# Altium integrated library LEMO Unipole And Multipole Type Connectors.IntLib: 1566 symbols (part 5 of 13)
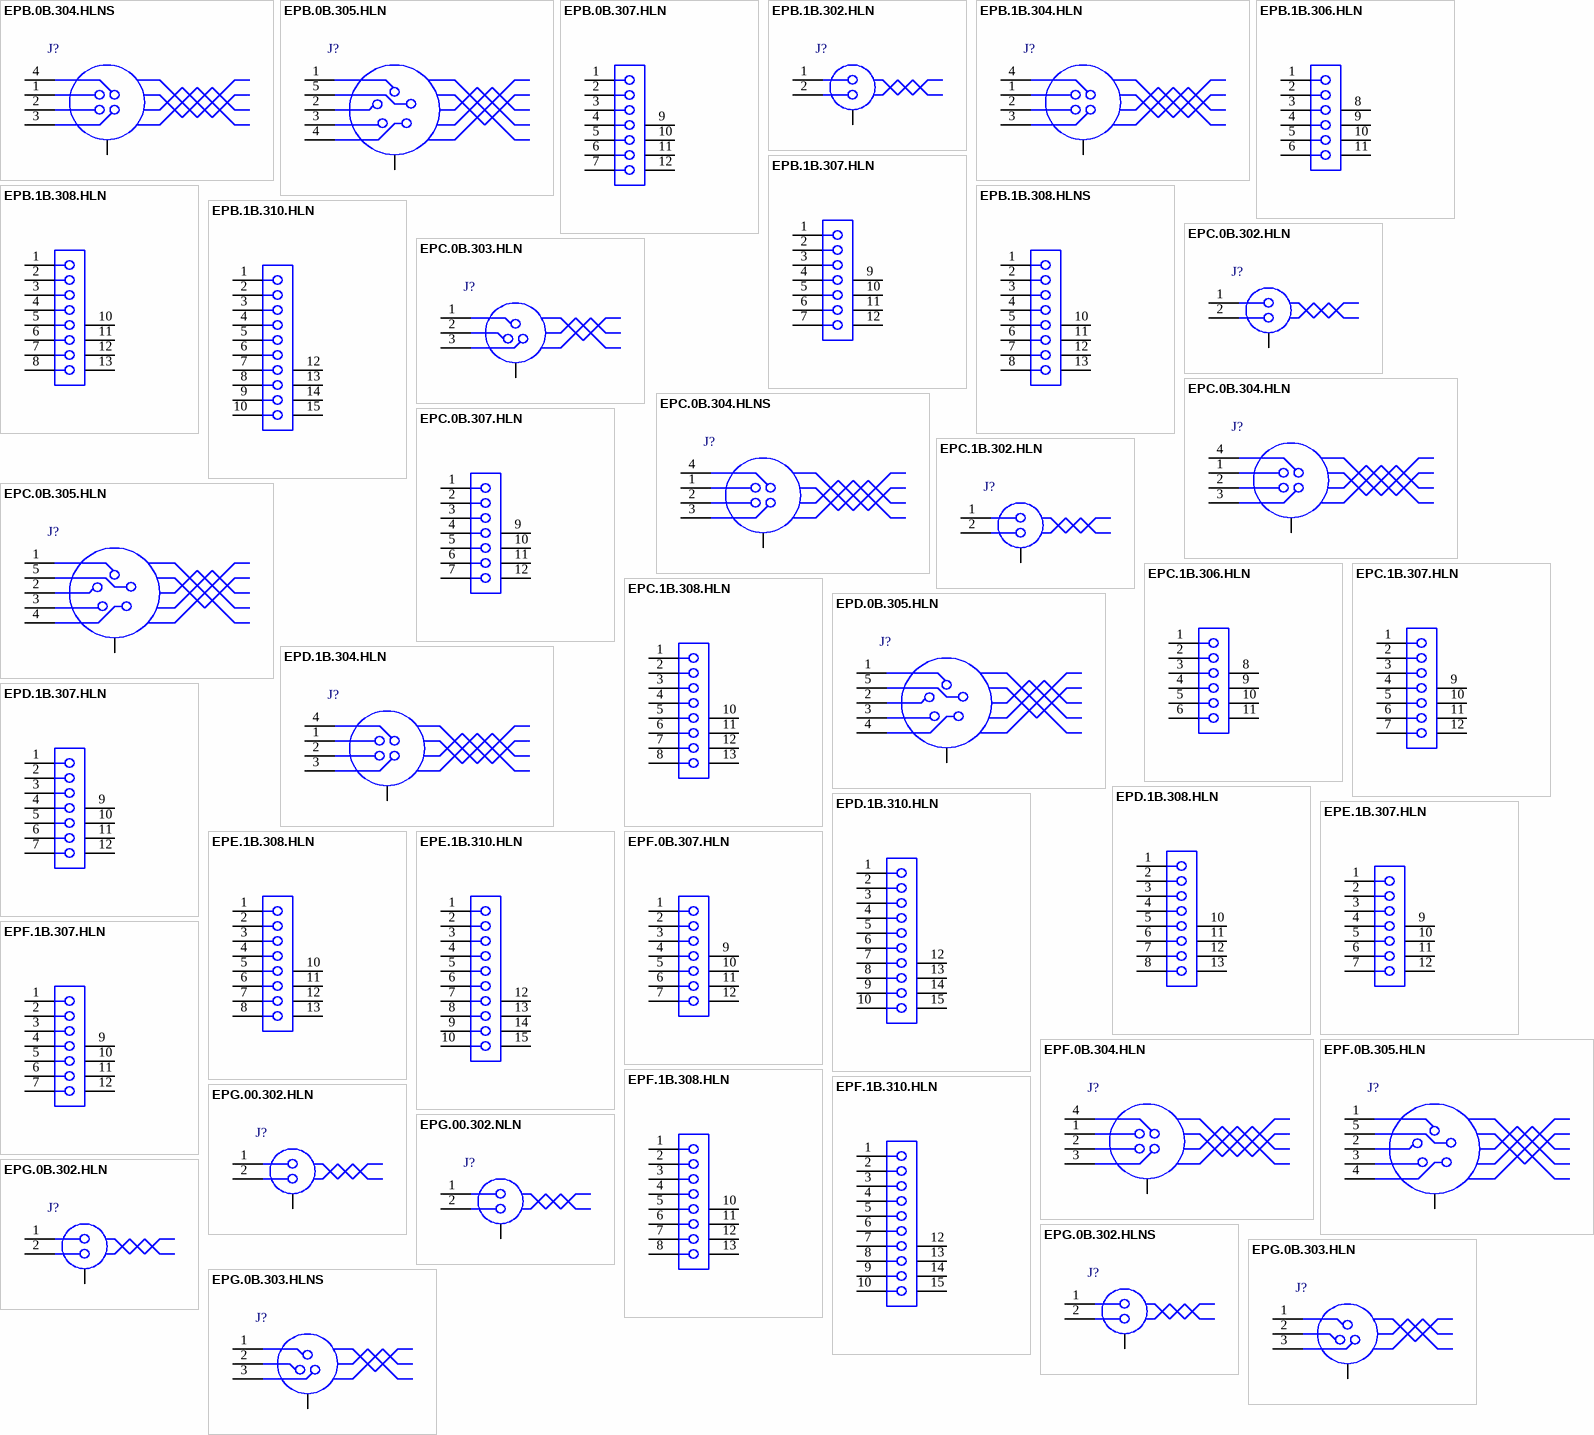
[diagram p47: symbols EPB.0B.304.HLNS to EPG.0B.303.HLNS]

## EPE.1B.310.HLN
designator J?
Elbow receptacle for printed circuit (solder or screw fixing), Key (E), 1B series, Multipole Type with 10 Contacts; Manufacturer: LEMO; PartNumber: EPE.1B.310.HLN; Number of contacts: 10; Contact Diameter: 0.5 mm; AWG: 28; Rated Current(A): 1.5.; DatasheetVersion: Jun-14; PackageReference: EPE.1B.310.HLN; PackageDescription: Elbow receptacle for printed circuit (solder or screw fixing), Key(E) for Printed Circuit; ComponentLink1Description: Manufacturer URL; ComponentLink1URL: http://www.lemo.com; ComponentLink2Description: Datasheet; ComponentLink2URL: http://intra.lemo.ch/catalog/ROW/UK_English/unipole_multipole.pdf
footprint EPE.1B.310.HLN (Socket, Female, Height 12.6 mm, Through hole)
pins: 1, 2, 3, 4, 5, 6, 7, 8, 9, 10, 12, 13, 14, 15

## EPF.0B.304.HLN
designator J?
Elbow receptacle for printed circuit (solder or screw fixing), Key (F), 0B series, Multipole Type with 4 Contacts; Manufacturer: LEMO; PartNumber: EPF.0B.304.HLN; Number of contacts: 4; Contact Diameter: 0.7 mm; AWG: 24; Rated Current(A): 6; DatasheetVersion: Jun-14; PackageReference: EPF.0B.304.HLN; PackageDescription: Elbow receptacle for printed circuit (solder or screw fixing), Key(F) for Printed Circuit; ComponentLink1Description: Manufacturer URL; ComponentLink1URL: http://www.lemo.com; ComponentLink2Description: Datasheet; ComponentLink2URL: http://intra.lemo.ch/catalog/ROW/UK_English/unipole_multipole.pdf
footprint EPF.0B.304.HLN (Socket, Female, Height 11.7 mm, Through hole)
pins: 1, 2, 3, 4, 6, 7, 8, 9

## EPF.0B.305.HLN
designator J?
Elbow receptacle for printed circuit (solder or screw fixing), Key (F), 0B series, Multipole Type with 5 Contacts; Manufacturer: LEMO; PartNumber: EPF.0B.305.HLN; Number of contacts: 5; Contact Diameter: 0.7 mm; AWG: 24; Rated Current(A): 6; DatasheetVersion: Jun-14; PackageReference: EPF.0B.305.HLN; PackageDescription: Elbow receptacle for printed circuit (solder or screw fixing), Key(F) for Printed Circuit; ComponentLink1Description: Manufacturer URL; ComponentLink1URL: http://www.lemo.com; ComponentLink2Description: Datasheet; ComponentLink2URL: http://intra.lemo.ch/catalog/ROW/UK_English/unipole_multipole.pdf
footprint EPF.0B.305.HLN (Socket, Female, Height 11.7 mm, Through hole)
pins: 1, 2, 3, 4, 5, 7, 8, 9, 10

## EPF.0B.307.HLN
designator J?
Elbow receptacle for printed circuit (solder or screw fixing), Key (F), 0B series, Multipole Type with 7 Contacts; Manufacturer: LEMO; PartNumber: EPF.0B.307.HLN; Number of contacts: 7; Contact Diameter: 0.5 mm; AWG: 28; Rated Current(A): 2; DatasheetVersion: Jun-14; PackageReference: EPF.0B.307.HLN; PackageDescription: Elbow receptacle for printed circuit (solder or screw fixing), Key(F) for Printed Circuit; ComponentLink1Description: Manufacturer URL; ComponentLink1URL: http://www.lemo.com; ComponentLink2Description: Datasheet; ComponentLink2URL: http://intra.lemo.ch/catalog/ROW/UK_English/unipole_multipole.pdf
footprint EPF.0B.307.HLN (Socket, Female, Height 11.7 mm, Through hole)
pins: 1, 2, 3, 4, 5, 6, 7, 9, 10, 11, 12

## EPF.1B.307.HLN
designator J?
Elbow receptacle for printed circuit (solder or screw fixing), Key (F), 1B series, Multipole Type with 7 Contacts; Manufacturer: LEMO; PartNumber: EPF.1B.307.HLN; Number of contacts: 7; Contact Diameter: 0.7 mm; AWG: 24; Rated Current(A): 6; DatasheetVersion: Jun-14; PackageReference: EPF.1B.307.HLN; PackageDescription: Elbow receptacle for printed circuit (solder or screw fixing), Key(F) for Printed Circuit; ComponentLink1Description: Manufacturer URL; ComponentLink1URL: http://www.lemo.com; ComponentLink2Description: Datasheet; ComponentLink2URL: http://intra.lemo.ch/catalog/ROW/UK_English/unipole_multipole.pdf
footprint EPF.1B.307.HLN (Socket, Female, Height 12.6 mm, Through hole)
pins: 1, 2, 3, 4, 5, 6, 7, 9, 10, 11, 12

## EPF.1B.308.HLN
designator J?
Elbow receptacle for printed circuit (solder or screw fixing), Key (F), 1B series, Multipole Type with 8 Contacts; Manufacturer: LEMO; PartNumber: EPF.1B.308.HLN; Number of contacts: 8; Contact Diameter: 0.7 mm; AWG: 24; Rated Current(A): 2; DatasheetVersion: Jun-14; PackageReference: EPF.1B.308.HLN; PackageDescription: Elbow receptacle for printed circuit (solder or screw fixing), Key(F) for Printed Circuit; ComponentLink1Description: Manufacturer URL; ComponentLink1URL: http://www.lemo.com; ComponentLink2Description: Datasheet; ComponentLink2URL: http://intra.lemo.ch/catalog/ROW/UK_English/unipole_multipole.pdf
footprint EPF.1B.308.HLN (Socket, Female, Height 12.6 mm, Through hole)
pins: 1, 2, 3, 4, 5, 6, 7, 8, 10, 11, 12, 13

## EPF.1B.310.HLN
designator J?
Elbow receptacle for printed circuit (solder or screw fixing), Key (F), 1B series, Multipole Type with 10 Contacts; Manufacturer: LEMO; PartNumber: EPF.1B.310.HLN; Number of contacts: 10; Contact Diameter: 0.5 mm; AWG: 28; Rated Current(A): 1.5.; DatasheetVersion: Jun-14; PackageReference: EPF.1B.310.HLN; PackageDescription: Elbow receptacle for printed circuit (solder or screw fixing), Key(F) for Printed Circuit; ComponentLink1Description: Manufacturer URL; ComponentLink1URL: http://www.lemo.com; ComponentLink2Description: Datasheet; ComponentLink2URL: http://intra.lemo.ch/catalog/ROW/UK_English/unipole_multipole.pdf
footprint EPF.1B.310.HLN (Socket, Female, Height 12.6 mm, Through hole)
pins: 1, 2, 3, 4, 5, 6, 7, 8, 9, 10, 12, 13, 14, 15

## EPG.00.302.HLN
designator J?
Elbow receptacle for printed circuit, Key (G), 00 series, Multipole Type with 2 Contacts; Manufacturer: LEMO; PartNumber: EPG.00.302.HLN; Number of contacts: 2; Contact Diameter: 0.5 mm; AWG: 28; DatasheetVersion: Jun-14; PackageReference: EPG.00.302.HLN; PackageDescription: Elbow receptacle for printed circuit, Key(G) for Printed Circuit; Supplier 1: Mouser; Supplier Part Number 1: 736-EPG00302HLN; Supplier 2: Newark; Supplier Part Number 2: 51T4356; Supplier 3: Farnell; Supplier Part Number 3: 2442843; Supplier 4: Digi-Key; Supplier Part Number 4: EPG.00.302.HLN-ND; Rated Current(A): 2; ComponentLink1Description: Manufacturer URL; ComponentLink1URL: http://www.lemo.com; ComponentLink2Description: Datasheet; ComponentLink2URL: http://intra.lemo.ch/catalog/ROW/UK_English/unipole_multipole.pdf
footprint EPG.00.302.HLN (Socket, Female, Height 7.1 mm, Through hole)
pins: 1, 2, 4, 5, 6, 7

## EPG.00.302.NLN
designator J?
Elbow receptacle for printed circuit, Key (G), 00 series, Multipole Type with 2 Contacts; Manufacturer: LEMO; PartNumber: EPG.00.302.NLN; Number of contacts: 2; Contact Diameter: 0.5 mm; AWG: 28; DatasheetVersion: Jun-14; PackageReference: EPG.00.302.NLN; PackageDescription: Elbow receptacle for printed circuit, Key(G) for Printed Circuit; Supplier 1: Mouser; Supplier Part Number 1: 736-EPG00302NLN; Supplier 2: Digi-Key; Supplier Part Number 2: EPG.00.302.NLN-ND; Rated Current(A): 2; ComponentLink1Description: Manufacturer URL; ComponentLink1URL: http://www.lemo.com; ComponentLink2Description: Datasheet; ComponentLink2URL: http://intra.lemo.ch/catalog/ROW/UK_English/unipole_multipole.pdf
footprint EPG.00.302.NLN (Socket, Female, Height 7.1 mm, Through hole)
pins: 1, 2, 4, 5, 6, 7

## EPG.0B.302.HLN
designator J?
Elbow receptacle for printed circuit (solder or screw fixing), Key (G), 0B series, Multipole Type with 2 Contacts; Manufacturer: LEMO; PartNumber: EPG.0B.302.HLN; Number of contacts: 2; Contact Diameter: 0.9 mm; AWG: 22; Rated Current(A): 6; DatasheetVersion: Jun-14; PackageReference: EPG.0B.302.HLN; PackageDescription: Elbow receptacle for printed circuit (solder or screw fixing), Key(G) for Printed Circuit; Supplier 1: Mouser; Supplier Part Number 1: 736-EPG0B302HLN; Supplier 2: Farnell; Supplier Part Number 2: 4315250; Supplier 3: Digi-Key; Supplier Part Number 3: 1124-1426-ND; ComponentLink1Description: Manufacturer URL; ComponentLink1URL: http://www.lemo.com; ComponentLink2Description: Datasheet; ComponentLink2URL: http://intra.lemo.ch/catalog/ROW/UK_English/unipole_multipole.pdf
footprint EPG.0B.302.HLN (Socket, Female, Height 11.7 mm, Through hole)
pins: 1, 2, 4, 5, 6, 7

## EPG.0B.302.HLNS
designator J?
Elbow receptacle for printed circuit (solder or screw fixing), Key (G), 0B series, Multipole Type with 2 Contacts; Manufacturer: LEMO; PartNumber: EPG.0B.302.HLNS; Number of contacts: 2; Contact Diameter: 0.9 mm; AWG: 22; Rated Current(A): 6; DatasheetVersion: Jun-14; PackageReference: EPG.0B.302.HLNS; PackageDescription: Elbow receptacle for printed circuit (solder or screw fixing), Key(G) for Printed Circuit; Supplier 1: Mouser; Supplier Part Number 1: 736-EPG0B302HLNS; Supplier 2: Digi-Key; Supplier Part Number 2: EPG.0B.302.HLNS-ND; ComponentLink1Description: Manufacturer URL; ComponentLink1URL: http://www.lemo.com; ComponentLink2Description: Datasheet; ComponentLink2URL: http://intra.lemo.ch/catalog/ROW/UK_English/unipole_multipole.pdf
footprint EPG.0B.302.HLNS (Socket, Female, Height 11.7 mm, Through hole)
pins: 1, 2, 4, 5, 6, 7

## EPG.0B.303.HLN
designator J?
Elbow receptacle for printed circuit (solder or screw fixing), Key (G), 0B series, Multipole Type with 3 Contacts; Manufacturer: LEMO; PartNumber: EPG.0B.303.HLN; Number of contacts: 3; Contact Diameter: 0.9 mm; AWG: 22; Rated Current(A): 6; DatasheetVersion: Jun-14; PackageReference: EPG.0B.303.HLN; PackageDescription: Elbow receptacle for printed circuit (solder or screw fixing), Key(G) for Printed Circuit; Supplier 1: Mouser; Supplier Part Number 1: 736-EPG0B303HLN; Supplier 2: Newark; Supplier Part Number 2: 48W1994; Supplier 3: Farnell; Supplier Part Number 3: 4315261; Supplier 4: Digi-Key; Supplier Part Number 4: 1124-1430-ND; ComponentLink1Description: Manufacturer URL; ComponentLink1URL: http://www.lemo.com; ComponentLink2Description: Datasheet; ComponentLink2URL: http://intra.lemo.ch/catalog/ROW/UK_English/unipole_multipole.pdf
footprint EPG.0B.303.HLN (Socket, Female, Height 11.7 mm, Through hole)
pins: 1, 2, 3, 5, 6, 7, 8

## EPG.0B.303.HLNS
designator J?
Elbow receptacle for printed circuit (solder or screw fixing), Key (G), 0B series, Multipole Type with 3 Contacts; Manufacturer: LEMO; PartNumber: EPG.0B.303.HLNS; Number of contacts: 3; Contact Diameter: 0.9 mm; AWG: 22; Rated Current(A): 6; DatasheetVersion: Jun-14; PackageReference: EPG.0B.303.HLNS; PackageDescription: Elbow receptacle for printed circuit (solder or screw fixing), Key(G) for Printed Circuit; Supplier 1: Mouser; Supplier Part Number 1: 736-EPG0B303HLNS; Supplier 2: Digi-Key; Supplier Part Number 2: EPG.0B.303.HLNS-ND; ComponentLink1Description: Manufacturer URL; ComponentLink1URL: http://www.lemo.com; ComponentLink2Description: Datasheet; ComponentLink2URL: http://intra.lemo.ch/catalog/ROW/UK_English/unipole_multipole.pdf
footprint EPG.0B.303.HLNS (Socket, Female, Height 11.7 mm, Through hole)
pins: 1, 2, 3, 5, 6, 7, 8

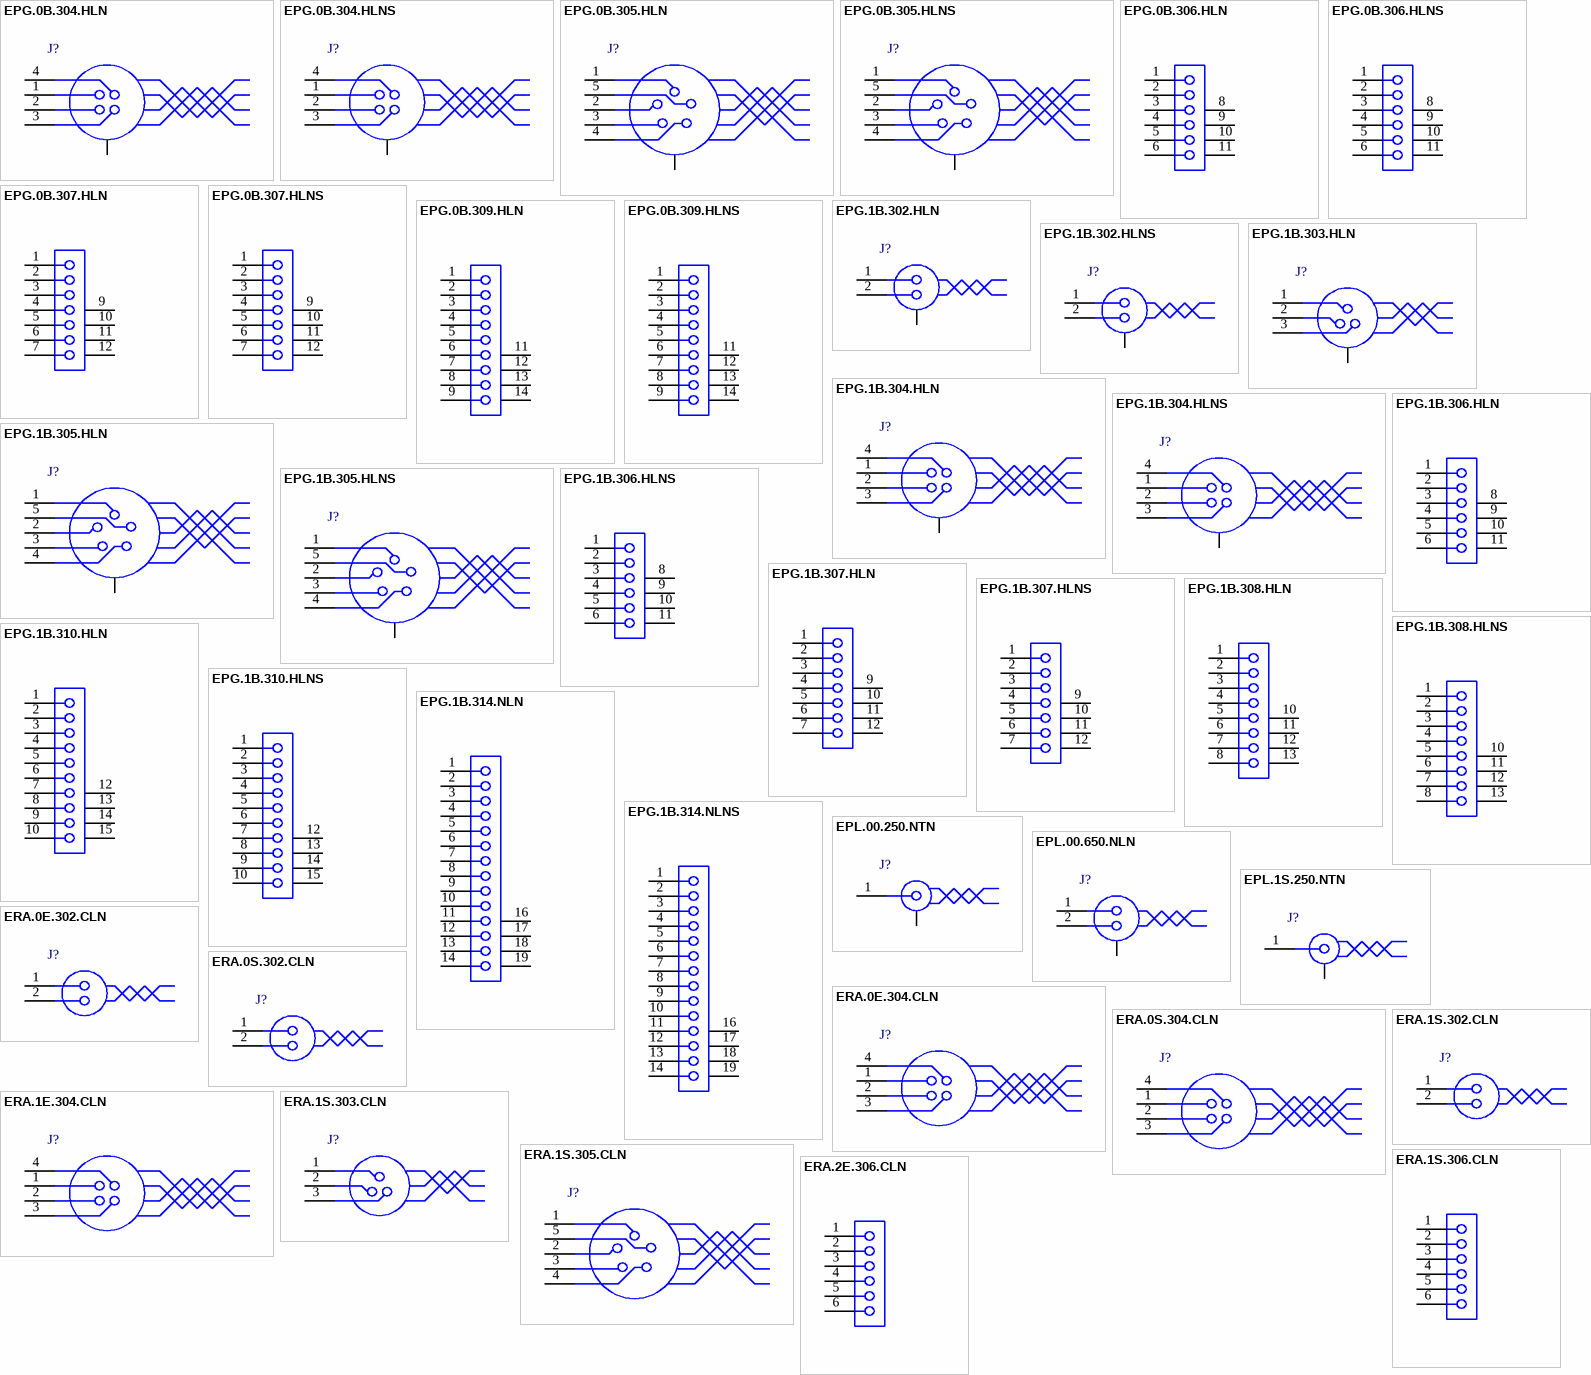
[diagram p14: symbols EPG.0B.304.HLN to ERA.2E.306.CLN]

## EPG.0B.304.HLN
designator J?
Elbow receptacle for printed circuit (solder or screw fixing), Key (G), 0B series, Multipole Type with 4 Contacts; Manufacturer: LEMO; PartNumber: EPG.0B.304.HLN; Number of contacts: 4; Contact Diameter: 0.7 mm; AWG: 24; Rated Current(A): 6; DatasheetVersion: Jun-14; PackageReference: EPG.0B.304.HLN; PackageDescription: Elbow receptacle for printed circuit (solder or screw fixing), Key(G) for Printed Circuit; Supplier 1: Mouser; Supplier Part Number 1: 736-EPG0B304HLN; Supplier 2: Newark; Supplier Part Number 2: 25R7484; Supplier 3: Farnell; Supplier Part Number 3: 4315273; Supplier 4: Digi-Key; Supplier Part Number 4: 1124-1351-ND; ComponentLink1Description: Manufacturer URL; ComponentLink1URL: http://www.lemo.com; ComponentLink2Description: Datasheet; ComponentLink2URL: http://intra.lemo.ch/catalog/ROW/UK_English/unipole_multipole.pdf
footprint EPG.0B.304.HLN (Socket, Female, Height 11.7 mm, Through hole)
pins: 1, 2, 3, 4, 6, 7, 8, 9

## EPG.0B.304.HLNS
designator J?
Elbow receptacle for printed circuit (solder or screw fixing), Key (G), 0B series, Multipole Type with 4 Contacts; Manufacturer: LEMO; PartNumber: EPG.0B.304.HLNS; Number of contacts: 4; Contact Diameter: 0.7 mm; AWG: 24; Rated Current(A): 6; DatasheetVersion: Jun-14; PackageReference: EPG.0B.304.HLNS; PackageDescription: Elbow receptacle for printed circuit (solder or screw fixing), Key(G) for Printed Circuit; Supplier 1: Mouser; Supplier Part Number 1: 736-EPG0B304HLNS; Supplier 2: Digi-Key; Supplier Part Number 2: EPG.0B.304.HLNS-ND; ComponentLink1Description: Manufacturer URL; ComponentLink1URL: http://www.lemo.com; ComponentLink2Description: Datasheet; ComponentLink2URL: http://intra.lemo.ch/catalog/ROW/UK_English/unipole_multipole.pdf
footprint EPG.0B.304.HLNS (Socket, Female, Height 11.7 mm, Through hole)
pins: 1, 2, 3, 4, 6, 7, 8, 9

## EPG.0B.305.HLN
designator J?
Elbow receptacle for printed circuit (solder or screw fixing), Key (G), 0B series, Multipole Type with 5 Contacts; Manufacturer: LEMO; PartNumber: EPG.0B.305.HLN; Number of contacts: 5; Contact Diameter: 0.7 mm; AWG: 24; Rated Current(A): 6; DatasheetVersion: Jun-14; PackageReference: EPG.0B.305.HLN; PackageDescription: Elbow receptacle for printed circuit (solder or screw fixing), Key(G) for Printed Circuit; Supplier 1: Mouser; Supplier Part Number 1: 736-EPG0B305HLN; Supplier 2: Farnell; Supplier Part Number 2: 4315285; Supplier 3: Digi-Key; Supplier Part Number 3: 1124-1352-ND; ComponentLink1Description: Manufacturer URL; ComponentLink1URL: http://www.lemo.com; ComponentLink2Description: Datasheet; ComponentLink2URL: http://intra.lemo.ch/catalog/ROW/UK_English/unipole_multipole.pdf
footprint EPG.0B.305.HLN (Socket, Female, Height 11.7 mm, Through hole)
pins: 1, 2, 3, 4, 5, 7, 8, 9, 10

## EPG.0B.305.HLNS
designator J?
Elbow receptacle for printed circuit (solder or screw fixing), Key (G), 0B series, Multipole Type with 5 Contacts; Manufacturer: LEMO; PartNumber: EPG.0B.305.HLNS; Number of contacts: 5; Contact Diameter: 0.7 mm; AWG: 24; Rated Current(A): 6; DatasheetVersion: Jun-14; PackageReference: EPG.0B.305.HLNS; PackageDescription: Elbow receptacle for printed circuit (solder or screw fixing), Key(G) for Printed Circuit; Supplier 1: Mouser; Supplier Part Number 1: 736-EPG0B305HLNS; Supplier 2: Digi-Key; Supplier Part Number 2: EPG.0B.305.HLNS-ND; ComponentLink1Description: Manufacturer URL; ComponentLink1URL: http://www.lemo.com; ComponentLink2Description: Datasheet; ComponentLink2URL: http://intra.lemo.ch/catalog/ROW/UK_English/unipole_multipole.pdf
footprint EPG.0B.305.HLNS (Socket, Female, Height 11.7 mm, Through hole)
pins: 1, 2, 3, 4, 5, 7, 8, 9, 10

## EPG.0B.306.HLN
designator J?
Elbow receptacle for printed circuit (solder or screw fixing), Key (G), 0B series, Multipole Type with 6 Contacts; Manufacturer: LEMO; PartNumber: EPG.0B.306.HLN; Number of contacts: 6; Contact Diameter: 0.5 mm; AWG: 28; Rated Current(A): 2.5.; DatasheetVersion: Jun-14; PackageReference: EPG.0B.306.HLN; PackageDescription: Elbow receptacle for printed circuit (solder or screw fixing), Key(G) for Printed Circuit; Supplier 1: Mouser; Supplier Part Number 1: 736-EPG0B306HLN; Supplier 2: Newark; Supplier Part Number 2: 25R7485; Supplier 3: Farnell; Supplier Part Number 3: 4315297; Supplier 4: Digi-Key; Supplier Part Number 4: EPG.0B.306.HLN-ND; ComponentLink1Description: Manufacturer URL; ComponentLink1URL: http://www.lemo.com; ComponentLink2Description: Datasheet; ComponentLink2URL: http://intra.lemo.ch/catalog/ROW/UK_English/unipole_multipole.pdf
footprint EPG.0B.306.HLN (Socket, Female, Height 11.7 mm, Through hole)
pins: 1, 2, 3, 4, 5, 6, 8, 9, 10, 11

## EPG.0B.306.HLNS
designator J?
Elbow receptacle for printed circuit (solder or screw fixing), Key (G), 0B series, Multipole Type with 6 Contacts; Manufacturer: LEMO; PartNumber: EPG.0B.306.HLNS; Number of contacts: 6; Contact Diameter: 0.5 mm; AWG: 28; Rated Current(A): 2.5.; DatasheetVersion: Jun-14; PackageReference: EPG.0B.306.HLNS; PackageDescription: Elbow receptacle for printed circuit (solder or screw fixing), Key(G) for Printed Circuit; ComponentLink1Description: Manufacturer URL; ComponentLink1URL: http://www.lemo.com; ComponentLink2Description: Datasheet; ComponentLink2URL: http://intra.lemo.ch/catalog/ROW/UK_English/unipole_multipole.pdf
footprint EPG.0B.306.HLNS (Socket, Female, Height 11.7 mm, Through hole)
pins: 1, 2, 3, 4, 5, 6, 8, 9, 10, 11

## EPG.0B.307.HLN
designator J?
Elbow receptacle for printed circuit (solder or screw fixing), Key (G), 0B series, Multipole Type with 7 Contacts; Manufacturer: LEMO; PartNumber: EPG.0B.307.HLN; Number of contacts: 7; Contact Diameter: 0.5 mm; AWG: 28; Rated Current(A): 2; DatasheetVersion: Jun-14; PackageReference: EPG.0B.307.HLN; PackageDescription: Elbow receptacle for printed circuit (solder or screw fixing), Key(G) for Printed Circuit; Supplier 1: Mouser; Supplier Part Number 1: 736-EPG0B307HLN; Supplier 2: Farnell; Supplier Part Number 2: 4315303; Supplier 3: Digi-Key; Supplier Part Number 3: EPG.0B.307.HLN-ND; ComponentLink1Description: Manufacturer URL; ComponentLink1URL: http://www.lemo.com; ComponentLink2Description: Datasheet; ComponentLink2URL: http://intra.lemo.ch/catalog/ROW/UK_English/unipole_multipole.pdf
footprint EPG.0B.307.HLN (Socket, Female, Height 11.7 mm, Through hole)
pins: 1, 2, 3, 4, 5, 6, 7, 9, 10, 11, 12

## EPG.0B.307.HLNS
designator J?
Elbow receptacle for printed circuit (solder or screw fixing), Key (G), 0B series, Multipole Type with 7 Contacts; Manufacturer: LEMO; PartNumber: EPG.0B.307.HLNS; Number of contacts: 7; Contact Diameter: 0.5 mm; AWG: 28; Rated Current(A): 2; DatasheetVersion: Jun-14; PackageReference: EPG.0B.307.HLNS; PackageDescription: Elbow receptacle for printed circuit (solder or screw fixing), Key(G) for Printed Circuit; Supplier 1: Mouser; Supplier Part Number 1: 736-EPG0B307HLNS; Supplier 2: Digi-Key; Supplier Part Number 2: EPG.0B.307.HLNS-ND; ComponentLink1Description: Manufacturer URL; ComponentLink1URL: http://www.lemo.com; ComponentLink2Description: Datasheet; ComponentLink2URL: http://intra.lemo.ch/catalog/ROW/UK_English/unipole_multipole.pdf
footprint EPG.0B.307.HLNS (Socket, Female, Height 11.7 mm, Through hole)
pins: 1, 2, 3, 4, 5, 6, 7, 9, 10, 11, 12

## EPG.0B.309.HLN
designator J?
Elbow receptacle for printed circuit (solder or screw fixing), Key (G), 0B series, Multipole Type with 9 Contacts; Manufacturer: LEMO; PartNumber: EPG.0B.309.HLN; Number of contacts: 9; Contact Diameter: 0.5 mm; AWG: 28; Rated Current(A): 1.5.; DatasheetVersion: Jun-14; PackageReference: EPG.0B.309.HLN; PackageDescription: Elbow receptacle for printed circuit (solder or screw fixing), Key(G) for Printed Circuit; Supplier 1: Mouser; Supplier Part Number 1: 736-EPG0B309HLN; Supplier 2: Digi-Key; Supplier Part Number 2: EPG.0B.309.HLN-ND; ComponentLink1Description: Manufacturer URL; ComponentLink1URL: http://www.lemo.com; ComponentLink2Description: Datasheet; ComponentLink2URL: http://intra.lemo.ch/catalog/ROW/UK_English/unipole_multipole.pdf
footprint EPG.0B.309.HLN (Socket, Female, Height 11.7 mm, Through hole)
pins: 1, 2, 3, 4, 5, 6, 7, 8, 9, 11, 12, 13, 14

## EPG.0B.309.HLNS
designator J?
Elbow receptacle for printed circuit (solder or screw fixing), Key (G), 0B series, Multipole Type with 9 Contacts; Manufacturer: LEMO; PartNumber: EPG.0B.309.HLNS; Number of contacts: 9; Contact Diameter: 0.5 mm; AWG: 28; Rated Current(A): 1.5.; DatasheetVersion: Jun-14; PackageReference: EPG.0B.309.HLNS; PackageDescription: Elbow receptacle for printed circuit (solder or screw fixing), Key(G) for Printed Circuit; ComponentLink1Description: Manufacturer URL; ComponentLink1URL: http://www.lemo.com; ComponentLink2Description: Datasheet; ComponentLink2URL: http://intra.lemo.ch/catalog/ROW/UK_English/unipole_multipole.pdf
footprint EPG.0B.309.HLNS (Socket, Female, Height 11.7 mm, Through hole)
pins: 1, 2, 3, 4, 5, 6, 7, 8, 9, 11, 12, 13, 14

## EPG.1B.302.HLN
designator J?
Elbow receptacle for printed circuit (solder or screw fixing), Key (G), 1B series, Multipole Type with 2 Contacts; Manufacturer: LEMO; PartNumber: EPG.1B.302.HLN; Number of contacts: 2; Contact Diameter: 1.3 mm; AWG: 20; Rated Current(A): 12; DatasheetVersion: Jun-14; PackageReference: EPG.1B.302.HLN; PackageDescription: Elbow receptacle for printed circuit (solder or screw fixing), Key(G) for Printed Circuit; Supplier 1: Mouser; Supplier Part Number 1: 736-EPG1B302HLN; Supplier 2: Newark; Supplier Part Number 2: 47T5909; Supplier 3: Digi-Key; Supplier Part Number 3: EPG.1B.302.HLN-ND; ComponentLink1Description: Manufacturer URL; ComponentLink1URL: http://www.lemo.com; ComponentLink2Description: Datasheet; ComponentLink2URL: http://intra.lemo.ch/catalog/ROW/UK_English/unipole_multipole.pdf
footprint EPG.1B.302.HLN (Socket, Female, Height 12.6 mm, Through hole)
pins: 1, 2, 4, 5, 6, 7

## EPG.1B.302.HLNS
designator J?
Elbow receptacle for printed circuit (solder or screw fixing), Key (G), 1B series, Multipole Type with 2 Contacts; Manufacturer: LEMO; PartNumber: EPG.1B.302.HLNS; Number of contacts: 2; Contact Diameter: 1.3 mm; AWG: 20; Rated Current(A): 12; DatasheetVersion: Jun-14; PackageReference: EPG.1B.302.HLNS; PackageDescription: Elbow receptacle for printed circuit (solder or screw fixing), Key(G) for Printed Circuit; ComponentLink1Description: Manufacturer URL; ComponentLink1URL: http://www.lemo.com; ComponentLink2Description: Datasheet; ComponentLink2URL: http://intra.lemo.ch/catalog/ROW/UK_English/unipole_multipole.pdf
footprint EPG.1B.302.HLNS (Socket, Female, Height 12.6 mm, Through hole)
pins: 1, 2, 4, 5, 6, 7

## EPG.1B.303.HLN
designator J?
Elbow receptacle for printed circuit (solder or screw fixing), Key (G), 1B series, Multipole Type with 3 Contacts; Manufacturer: LEMO; PartNumber: EPG.1B.303.HLN; Number of contacts: 3; Contact Diameter: 1.3 mm; AWG: 20; Rated Current(A): 4.5.; DatasheetVersion: Jun-14; PackageReference: EPG.1B.303.HLN; PackageDescription: Elbow receptacle for printed circuit (solder or screw fixing), Key(G) for Printed Circuit; Supplier 1: Mouser; Supplier Part Number 1: 736-EPG1B303HLN; Supplier 2: Newark; Supplier Part Number 2: 32T2205; Supplier 3: Farnell; Supplier Part Number 3: 4315315; Supplier 4: Digi-Key; Supplier Part Number 4: EPG.1B.303.HLN-ND; ComponentLink1Description: Manufacturer URL; ComponentLink1URL: http://www.lemo.com; ComponentLink2Description: Datasheet; ComponentLink2URL: http://intra.lemo.ch/catalog/ROW/UK_English/unipole_multipole.pdf
footprint EPG.1B.303.HLN (Socket, Female, Height 12.6 mm, Through hole)
pins: 1, 2, 3, 5, 6, 7, 8

## EPG.1B.304.HLN
designator J?
Elbow receptacle for printed circuit (solder or screw fixing), Key (G), 1B series, Multipole Type with 4 Contacts; Manufacturer: LEMO; PartNumber: EPG.1B.304.HLN; Number of contacts: 4; Contact Diameter: 0.9 mm; AWG: 22; Rated Current(A): 6; DatasheetVersion: Jun-14; PackageReference: EPG.1B.304.HLN; PackageDescription: Elbow receptacle for printed circuit (solder or screw fixing), Key(G) for Printed Circuit; Supplier 1: Mouser; Supplier Part Number 1: 736-EPG1B304HLN; Supplier 2: Farnell; Supplier Part Number 2: 4315327; Supplier 3: Digi-Key; Supplier Part Number 3: EPG.1B.304.HLN-ND; ComponentLink1Description: Manufacturer URL; ComponentLink1URL: http://www.lemo.com; ComponentLink2Description: Datasheet; ComponentLink2URL: http://intra.lemo.ch/catalog/ROW/UK_English/unipole_multipole.pdf
footprint EPG.1B.304.HLN (Socket, Female, Height 12.6 mm, Through hole)
pins: 1, 2, 3, 4, 6, 7, 8, 9

## EPG.1B.304.HLNS
designator J?
Elbow receptacle for printed circuit (solder or screw fixing), Key (G), 1B series, Multipole Type with 4 Contacts; Manufacturer: LEMO; PartNumber: EPG.1B.304.HLNS; Number of contacts: 4; Contact Diameter: 0.9 mm; AWG: 22; Rated Current(A): 6; DatasheetVersion: Jun-14; PackageReference: EPG.1B.304.HLNS; PackageDescription: Elbow receptacle for printed circuit (solder or screw fixing), Key(G) for Printed Circuit; Supplier 1: Mouser; Supplier Part Number 1: 736-EPG1B304HLNS; Supplier 2: Digi-Key; Supplier Part Number 2: EPG.1B.304.HLNS-ND; ComponentLink1Description: Manufacturer URL; ComponentLink1URL: http://www.lemo.com; ComponentLink2Description: Datasheet; ComponentLink2URL: http://intra.lemo.ch/catalog/ROW/UK_English/unipole_multipole.pdf
footprint EPG.1B.304.HLNS (Socket, Female, Height 12.6 mm, Through hole)
pins: 1, 2, 3, 4, 6, 7, 8, 9

## EPG.1B.305.HLN
designator J?
Elbow receptacle for printed circuit (solder or screw fixing), Key (G), 1B series, Multipole Type with 5 Contacts; Manufacturer: LEMO; PartNumber: EPG.1B.305.HLN; Number of contacts: 5; Contact Diameter: 0.9 mm; AWG: 22; Rated Current(A): 6; DatasheetVersion: Jun-14; PackageReference: EPG.1B.305.HLN; PackageDescription: Elbow receptacle for printed circuit (solder or screw fixing), Key(G) for Printed Circuit; Supplier 1: Mouser; Supplier Part Number 1: 736-EPG1B305HLN; Supplier 2: Digi-Key; Supplier Part Number 2: EPG.1B.305.HLN-ND; ComponentLink1Description: Manufacturer URL; ComponentLink1URL: http://www.lemo.com; ComponentLink2Description: Datasheet; ComponentLink2URL: http://intra.lemo.ch/catalog/ROW/UK_English/unipole_multipole.pdf
footprint EPG.1B.305.HLN (Socket, Female, Height 12.6 mm, Through hole)
pins: 1, 2, 3, 4, 5, 7, 8, 9, 10

## EPG.1B.305.HLNS
designator J?
Elbow receptacle for printed circuit (solder or screw fixing), Key (G), 1B series, Multipole Type with 5 Contacts; Manufacturer: LEMO; PartNumber: EPG.1B.305.HLNS; Number of contacts: 5; Contact Diameter: 0.9 mm; AWG: 22; Rated Current(A): 6; DatasheetVersion: Jun-14; PackageReference: EPG.1B.305.HLNS; PackageDescription: Elbow receptacle for printed circuit (solder or screw fixing), Key(G) for Printed Circuit; Supplier 1: Mouser; Supplier Part Number 1: 736-EPG1B305HLNS; Supplier 2: Digi-Key; Supplier Part Number 2: EPG.1B.305.HLNS-ND; ComponentLink1Description: Manufacturer URL; ComponentLink1URL: http://www.lemo.com; ComponentLink2Description: Datasheet; ComponentLink2URL: http://intra.lemo.ch/catalog/ROW/UK_English/unipole_multipole.pdf
footprint EPG.1B.305.HLNS (Socket, Female, Height 12.6 mm, Through hole)
pins: 1, 2, 3, 4, 5, 7, 8, 9, 10

## EPG.1B.306.HLN
designator J?
Elbow receptacle for printed circuit (solder or screw fixing), Key (G), 1B series, Multipole Type with 6 Contacts; Manufacturer: LEMO; PartNumber: EPG.1B.306.HLN; Number of contacts: 6; Contact Diameter: 0.7 mm; AWG: 24; DatasheetVersion: Jun-14; PackageReference: EPG.1B.306.HLN; PackageDescription: Elbow receptacle for printed circuit (solder or screw fixing), Key(G) for Printed Circuit; Supplier 1: Mouser; Supplier Part Number 1: 736-EPG1B306HLN; Supplier 2: Newark; Supplier Part Number 2: 64R6456; Supplier 3: Farnell; Supplier Part Number 3: 4315340; Supplier 4: Digi-Key; Supplier Part Number 4: 1124-1353-ND; Rated Current(A): 6; ComponentLink1Description: Manufacturer URL; ComponentLink1URL: http://www.lemo.com; ComponentLink2Description: Datasheet; ComponentLink2URL: http://intra.lemo.ch/catalog/ROW/UK_English/unipole_multipole.pdf
footprint EPG.1B.306.HLN (Socket, Female, Height 12.6 mm, Through hole)
pins: 1, 2, 3, 4, 5, 6, 8, 9, 10, 11

## EPG.1B.306.HLNS
designator J?
Elbow receptacle for printed circuit (solder or screw fixing), Key (G), 1B series, Multipole Type with 6 Contacts; Manufacturer: LEMO; PartNumber: EPG.1B.306.HLNS; Number of contacts: 6; Contact Diameter: 0.7 mm; AWG: 24; DatasheetVersion: Jun-14; PackageReference: EPG.1B.306.HLNS; PackageDescription: Elbow receptacle for printed circuit (solder or screw fixing), Key(G) for Printed Circuit; Supplier 1: Mouser; Supplier Part Number 1: 736-EPG1B306HLNS; Supplier 2: Digi-Key; Supplier Part Number 2: EPG.1B.306.HLNS-ND; Rated Current(A): 6; ComponentLink1Description: Manufacturer URL; ComponentLink1URL: http://www.lemo.com; ComponentLink2Description: Datasheet; ComponentLink2URL: http://intra.lemo.ch/catalog/ROW/UK_English/unipole_multipole.pdf
footprint EPG.1B.306.HLNS (Socket, Female, Height 12.6 mm, Through hole)
pins: 1, 2, 3, 4, 5, 6, 8, 9, 10, 11

## EPG.1B.307.HLN
designator J?
Elbow receptacle for printed circuit (solder or screw fixing), Key (G), 1B series, Multipole Type with 7 Contacts; Manufacturer: LEMO; PartNumber: EPG.1B.307.HLN; Number of contacts: 7; Contact Diameter: 0.7 mm; AWG: 24; Rated Current(A): 6; DatasheetVersion: Jun-14; PackageReference: EPG.1B.307.HLN; PackageDescription: Elbow receptacle for printed circuit (solder or screw fixing), Key(G) for Printed Circuit; Supplier 1: Mouser; Supplier Part Number 1: 736-EPG1B307HLN; Supplier 2: Farnell; Supplier Part Number 2: 4315352; Supplier 3: Digi-Key; Supplier Part Number 3: 1124-1354-ND; ComponentLink1Description: Manufacturer URL; ComponentLink1URL: http://www.lemo.com; ComponentLink2Description: Datasheet; ComponentLink2URL: http://intra.lemo.ch/catalog/ROW/UK_English/unipole_multipole.pdf
footprint EPG.1B.307.HLN (Socket, Female, Height 12.6 mm, Through hole)
pins: 1, 2, 3, 4, 5, 6, 7, 9, 10, 11, 12

## EPG.1B.307.HLNS
designator J?
Elbow receptacle for printed circuit (solder or screw fixing), Key (G), 1B series, Multipole Type with 7 Contacts; Manufacturer: LEMO; PartNumber: EPG.1B.307.HLNS; Number of contacts: 7; Contact Diameter: 0.7 mm; AWG: 24; Rated Current(A): 6; DatasheetVersion: Jun-14; PackageReference: EPG.1B.307.HLNS; PackageDescription: Elbow receptacle for printed circuit (solder or screw fixing), Key(G) for Printed Circuit; Supplier 1: Mouser; Supplier Part Number 1: 736-EPG1B307HLNS; Supplier 2: Digi-Key; Supplier Part Number 2: EPG.1B.307.HLNS-ND; ComponentLink1Description: Manufacturer URL; ComponentLink1URL: http://www.lemo.com; ComponentLink2Description: Datasheet; ComponentLink2URL: http://intra.lemo.ch/catalog/ROW/UK_English/unipole_multipole.pdf
footprint EPG.1B.307.HLNS (Socket, Female, Height 12.6 mm, Through hole)
pins: 1, 2, 3, 4, 5, 6, 7, 9, 10, 11, 12

## EPG.1B.308.HLN
designator J?
Elbow receptacle for printed circuit (solder or screw fixing), Key (G), 1B series, Multipole Type with 8 Contacts; Manufacturer: LEMO; PartNumber: EPG.1B.308.HLN; Number of contacts: 8; Contact Diameter: 0.7 mm; AWG: 24; Rated Current(A): 2; DatasheetVersion: Jun-14; PackageReference: EPG.1B.308.HLN; PackageDescription: Elbow receptacle for printed circuit (solder or screw fixing), Key(G) for Printed Circuit; Supplier 1: Mouser; Supplier Part Number 1: 736-EPG1B308HLN; Supplier 2: Farnell; Supplier Part Number 2: 4315364; Supplier 3: Digi-Key; Supplier Part Number 3: 1124-1433-ND; ComponentLink1Description: Manufacturer URL; ComponentLink1URL: http://www.lemo.com; ComponentLink2Description: Datasheet; ComponentLink2URL: http://intra.lemo.ch/catalog/ROW/UK_English/unipole_multipole.pdf
footprint EPG.1B.308.HLN (Socket, Female, Height 12.6 mm, Through hole)
pins: 1, 2, 3, 4, 5, 6, 7, 8, 10, 11, 12, 13

## EPG.1B.308.HLNS
designator J?
Elbow receptacle for printed circuit (solder or screw fixing), Key (G), 1B series, Multipole Type with 8 Contacts; Manufacturer: LEMO; PartNumber: EPG.1B.308.HLNS; Number of contacts: 8; Contact Diameter: 0.7 mm; AWG: 24; Rated Current(A): 2; DatasheetVersion: Jun-14; PackageReference: EPG.1B.308.HLNS; PackageDescription: Elbow receptacle for printed circuit (solder or screw fixing), Key(G) for Printed Circuit; Supplier 1: Mouser; Supplier Part Number 1: 736-EPG1B308HLNS; Supplier 2: Digi-Key; Supplier Part Number 2: EPG.1B.308.HLNS-ND; ComponentLink1Description: Manufacturer URL; ComponentLink1URL: http://www.lemo.com; ComponentLink2Description: Datasheet; ComponentLink2URL: http://intra.lemo.ch/catalog/ROW/UK_English/unipole_multipole.pdf
footprint EPG.1B.308.HLNS (Socket, Female, Height 12.6 mm, Through hole)
pins: 1, 2, 3, 4, 5, 6, 7, 8, 10, 11, 12, 13

## EPG.1B.310.HLN
designator J?
Elbow receptacle for printed circuit (solder or screw fixing), Key (G), 1B series, Multipole Type with 10 Contacts; Manufacturer: LEMO; PartNumber: EPG.1B.310.HLN; Number of contacts: 10; Contact Diameter: 0.5 mm; AWG: 28; Rated Current(A): 1.5.; DatasheetVersion: Jun-14; PackageReference: EPG.1B.310.HLN; PackageDescription: Elbow receptacle for printed circuit (solder or screw fixing), Key(G) for Printed Circuit; Supplier 1: Mouser; Supplier Part Number 1: 736-EPG1B310HLN; Supplier 2: Farnell; Supplier Part Number 2: 4315376; Supplier 3: Digi-Key; Supplier Part Number 3: 1124-1053-ND; ComponentLink1Description: Manufacturer URL; ComponentLink1URL: http://www.lemo.com; ComponentLink2Description: Datasheet; ComponentLink2URL: http://intra.lemo.ch/catalog/ROW/UK_English/unipole_multipole.pdf
footprint EPG.1B.310.HLN (Socket, Female, Height 12.6 mm, Through hole)
pins: 1, 2, 3, 4, 5, 6, 7, 8, 9, 10, 12, 13, 14, 15

## EPG.1B.310.HLNS
designator J?
Elbow receptacle for printed circuit (solder or screw fixing), Key (G), 1B series, Multipole Type with 10 Contacts; Manufacturer: LEMO; PartNumber: EPG.1B.310.HLNS; Number of contacts: 10; Contact Diameter: 0.5 mm; AWG: 28; Rated Current(A): 1.5.; DatasheetVersion: Jun-14; PackageReference: EPG.1B.310.HLNS; PackageDescription: Elbow receptacle for printed circuit (solder or screw fixing), Key(G) for Printed Circuit; Supplier 1: Mouser; Supplier Part Number 1: 736-EPG1B310HLNS; Supplier 2: Digi-Key; Supplier Part Number 2: EPG.1B.310.HLNS-ND; ComponentLink1Description: Manufacturer URL; ComponentLink1URL: http://www.lemo.com; ComponentLink2Description: Datasheet; ComponentLink2URL: http://intra.lemo.ch/catalog/ROW/UK_English/unipole_multipole.pdf
footprint EPG.1B.310.HLNS (Socket, Female, Height 12.6 mm, Through hole)
pins: 1, 2, 3, 4, 5, 6, 7, 8, 9, 10, 12, 13, 14, 15

## EPG.1B.314.NLN
designator J?
Elbow receptacle for printed circuit (solder or screw fixing), Key (G), 1B series, Multipole Type with 14 Contacts; Manufacturer: LEMO; PartNumber: EPG.1B.314.NLN; Number of contacts: 14; Contact Diameter: 0.5 mm; AWG: 28; Rated Current(A): 1; DatasheetVersion: Jun-14; PackageReference: EPG.1B.314.NLN; PackageDescription: Elbow receptacle for printed circuit (solder or screw fixing), Key(G) for Printed Circuit; Supplier 1: Mouser; Supplier Part Number 1: 736-EPG1B314NLN; Supplier 2: Digi-Key; Supplier Part Number 2: EPG.1B.314.NLN-ND; ComponentLink1Description: Manufacturer URL; ComponentLink1URL: http://www.lemo.com; ComponentLink2Description: Datasheet; ComponentLink2URL: http://intra.lemo.ch/catalog/ROW/UK_English/unipole_multipole.pdf
footprint EPG.1B.314.NLN (Socket, Female, Height 15.4 mm, Through hole)
pins: 1, 2, 3, 4, 5, 6, 7, 8, 9, 10, 11, 12, 13, 14, 16, 17, 18, 19

## EPG.1B.314.NLNS
designator J?
Elbow receptacle for printed circuit (solder or screw fixing), Key (G), 1B series, Multipole Type with 14 Contacts; Manufacturer: LEMO; PartNumber: EPG.1B.314.NLNS; Number of contacts: 14; Contact Diameter: 0.5 mm; AWG: 28; Rated Current(A): 1; DatasheetVersion: Jun-14; PackageReference: EPG.1B.314.NLNS; PackageDescription: Elbow receptacle for printed circuit (solder or screw fixing), Key(G) for Printed Circuit; ComponentLink1Description: Manufacturer URL; ComponentLink1URL: http://www.lemo.com; ComponentLink2Description: Datasheet; ComponentLink2URL: http://intra.lemo.ch/catalog/ROW/UK_English/unipole_multipole.pdf
footprint EPG.1B.314.NLNS (Socket, Female, Height 15.4 mm, Through hole)
pins: 1, 2, 3, 4, 5, 6, 7, 8, 9, 10, 11, 12, 13, 14, 16, 17, 18, 19

## EPL.00.250.NTN
designator J?
Elbow receptacle for printed circuit,  0 series, Coaxial Type with 1 Coax (50 Ohm); Manufacturer: LEMO; PartNumber: EPL.00.250.NTN; Number of contacts: 1; Contact Diameter: 0.7 mm; AWG: 0; Rated Current(A): 4; DatasheetVersion: Jun-14; PackageReference: EPL.00.250.NTN; PackageDescription: Elbow receptacle for printed circuit, Key(L) for Printed Circuit; Supplier 1: Mouser; Supplier Part Number 1: 736-EPL00250NTN; Supplier 2: Newark; Supplier Part Number 2: 25R7486; Supplier 3: Farnell; Supplier Part Number 3: 3817866; Supplier 4: Digi-Key; Supplier Part Number 4: 1124-1008-ND; ComponentLink1Description: Manufacturer URL; ComponentLink1URL: http://www.lemo.com; ComponentLink2Description: Datasheet; ComponentLink2URL: http://intra.lemo.ch/catalog/ROW/UK_English/00and01Coaxial_en.pdf
footprint EPL.00.250.NTN (Socket, Female, Through hole)
pins: 1, S1, S2, S3, S4

## EPL.00.650.NLN
designator J?
Elbow receptacle for printed circuit, 00 series, Triaxial Type with 1 Triax (50 Ohm); Manufacturer: LEMO; PartNumber: EPL.00.650.NLN; Number of contacts: 1; Contact Diameter: 0.5 mm; AWG: 0; Rated Current(A): 3; DatasheetVersion: Jun-14; PackageReference: EPL.00.650.NLN; PackageDescription: Elbow receptacle for printed circuit, Key(L) for Printed Circuit; Supplier 1: Mouser; Supplier Part Number 1: 736-EPL00650NLN; Supplier 2: Digi-Key; Supplier Part Number 2: EPL.00.650.NLN-ND; ComponentLink1Description: Manufacturer URL; ComponentLink1URL: http://www.lemo.com; ComponentLink2Description: Datasheet; ComponentLink2URL: http://intra.lemo.ch/catalog/ROW/UK_English/Coax_triax_mixed_en.pdf
footprint EPL.00.650.NLN (Socket, Female, Through hole)
pins: 1, 2, S1, S2, S3, S4

## EPL.1S.250.NTN
designator J?
Elbow receptacle for printed circuit,  1S series, Coaxial Type with 1 Coax (50 Ohm); Manufacturer: LEMO; PartNumber: EPL.1S.250.NTN; Number of contacts: 1; Contact Diameter: 1.6 mm; AWG: 0; Rated Current(A): 12; DatasheetVersion: Jun-14; PackageReference: EPL.1S.250.NTN; PackageDescription: Elbow receptacle for printed circuit,for Printed Circuit; ComponentLink1Description: Manufacturer URL; ComponentLink1URL: http://www.lemo.com; ComponentLink2Description: Datasheet; ComponentLink2URL: http://intra.lemo.ch/catalog/ROW/UK_English/Coax_triax_mixed_en.pdf
footprint EPL.1S.250.NTN (Socket, Female, Through hole)
pins: 1, 3, 4, 5, 6

## ERA.0E.302.CLN
designator J?
Fixed receptacle, nut fixing, Key (A), 0E series, Multipole Type with 2 Contacts; Manufacturer: LEMO; PartNumber: ERA.0E.302.CLN; Number of contacts: 2; Contact Diameter: 0.9 mm; AWG: 22; Rated Current(A): 10; DatasheetVersion: Jun-14; PackageReference: ERA.0E.302.CLN; PackageDescription: Fixed receptacle, nut fixing, Key(A) for Printed Circuit; ComponentLink1Description: Manufacturer URL; ComponentLink1URL: http://www.lemo.com; ComponentLink2Description: Datasheet; ComponentLink2URL: http://intra.lemo.ch/catalog/ROW/UK_English/unipole_multipole.pdf
footprint ERA.0E.302.CLN (Socket, Female, Body 14mm dia., Through hole)
pins: 1, 2

## ERA.0E.304.CLN
designator J?
Fixed receptacle, nut fixing, Key (A), 0E series, Multipole Type with 4 Contacts; Manufacturer: LEMO; PartNumber: ERA.0E.304.CLN; Number of contacts: 4; Contact Diameter: 0.7 mm; AWG: 24; Rated Current(A): 7; DatasheetVersion: Jun-14; PackageReference: ERA.0E.304.CLN; PackageDescription: Fixed receptacle, nut fixing, Key(A) for Printed Circuit; ComponentLink1Description: Manufacturer URL; ComponentLink1URL: http://www.lemo.com; ComponentLink2Description: Datasheet; ComponentLink2URL: http://intra.lemo.ch/catalog/ROW/UK_English/unipole_multipole.pdf
footprint ERA.0E.304.CLN (Socket, Female, Body 14mm dia., Through hole)
pins: 1, 2, 3, 4

## ERA.0S.302.CLN
designator J?
Fixed receptacle, nut fixing, 0S series, Multipole Type with 2 Contacts; Manufacturer: LEMO; PartNumber: ERA.0S.302.CLN; Number of contacts: 2; Contact Diameter: 0.9 mm; AWG: 22; Rated Current(A): 10; DatasheetVersion: Jun-14; PackageReference: ERA.0S.302.CLN; PackageDescription: Fixed receptacle, nut fixing,  for Printed Circuit; ComponentLink1Description: Manufacturer URL; ComponentLink1URL: http://www.lemo.com; ComponentLink2Description: Datasheet; ComponentLink2URL: http://intra.lemo.ch/catalog/ROW/UK_English/unipole_multipole.pdf
footprint ERA.0S.302.CLN (Socket, Female, Body 9mm dia., Through hole)
pins: 1, 2

## ERA.0S.304.CLN
designator J?
Fixed receptacle, nut fixing, 0S series, Multipole Type with 4 Contacts; Manufacturer: LEMO; PartNumber: ERA.0S.304.CLN; Number of contacts: 4; Contact Diameter: 0.7 mm; AWG: 24; Rated Current(A): 7; DatasheetVersion: Jun-14; PackageReference: ERA.0S.304.CLN; PackageDescription: Fixed receptacle, nut fixing,  for Printed Circuit; Supplier 1: Mouser; Supplier Part Number 1: 736-ERA0S304CLN; Supplier 2: Digi-Key; Supplier Part Number 2: ERA.0S.304.CLN-ND; ComponentLink1Description: Manufacturer URL; ComponentLink1URL: http://www.lemo.com; ComponentLink2Description: Datasheet; ComponentLink2URL: http://intra.lemo.ch/catalog/ROW/UK_English/unipole_multipole.pdf
footprint ERA.0S.304.CLN (Socket, Female, Body 9mm dia., Through hole)
pins: 1, 2, 3, 4

## ERA.1E.304.CLN
designator J?
Fixed receptacle, nut fixing, Key (A), 1E series, Multipole Type with 4 Contacts; Manufacturer: LEMO; PartNumber: ERA.1E.304.CLN; Number of contacts: 4; Contact Diameter: 0.9 mm; AWG: 22; Rated Current(A): 10; DatasheetVersion: Jun-14; PackageReference: ERA.1E.304.CLN; PackageDescription: Fixed receptacle, nut fixing, Key(A) for Printed Circuit; ComponentLink1Description: Manufacturer URL; ComponentLink1URL: http://www.lemo.com; ComponentLink2Description: Datasheet; ComponentLink2URL: http://intra.lemo.ch/catalog/ROW/UK_English/unipole_multipole.pdf
footprint ERA.1E.304.CLN (Socket, Female, Body 16mm dia., Through hole)
pins: 1, 2, 3, 4

## ERA.1S.302.CLN
designator J?
Fixed receptacle, nut fixing, 1S series, Multipole Type with 2 Contacts; Manufacturer: LEMO; PartNumber: ERA.1S.302.CLN; Number of contacts: 2; Contact Diameter: 1.3 mm; AWG: 20; Rated Current(A): 15; DatasheetVersion: Jun-14; PackageReference: ERA.1S.302.CLN; PackageDescription: Fixed receptacle, nut fixing,  for Printed Circuit; ComponentLink1Description: Manufacturer URL; ComponentLink1URL: http://www.lemo.com; ComponentLink2Description: Datasheet; ComponentLink2URL: http://intra.lemo.ch/catalog/ROW/UK_English/unipole_multipole.pdf
footprint ERA.1S.302.CLN (Socket, Female, Body 12mm dia., Through hole)
pins: 1, 2

## ERA.1S.303.CLN
designator J?
Fixed receptacle, nut fixing, 1S series, Multipole Type with 3 Contacts; Manufacturer: LEMO; PartNumber: ERA.1S.303.CLN; Number of contacts: 3; Contact Diameter: 0.9 mm; AWG: 22; Rated Current(A): 10; DatasheetVersion: Jun-14; PackageReference: ERA.1S.303.CLN; PackageDescription: Fixed receptacle, nut fixing,  for Printed Circuit; ComponentLink1Description: Manufacturer URL; ComponentLink1URL: http://www.lemo.com; ComponentLink2Description: Datasheet; ComponentLink2URL: http://intra.lemo.ch/catalog/ROW/UK_English/unipole_multipole.pdf
footprint ERA.1S.303.CLN (Socket, Female, Body 12mm dia., Through hole)
pins: 1, 2, 3

## ERA.1S.305.CLN
designator J?
Fixed receptacle, nut fixing, 1S series, Multipole Type with 5 Contacts; Manufacturer: LEMO; PartNumber: ERA.1S.305.CLN; Number of contacts: 5; AWG: 0; DatasheetVersion: Jun-14; PackageReference: ERA.1S.305.CLN; PackageDescription: Fixed receptacle, nut fixing,  for Printed Circuit; Rated Current(A): 0; ComponentLink1Description: Manufacturer URL; ComponentLink1URL: http://www.lemo.com; ComponentLink2Description: Datasheet; ComponentLink2URL: http://intra.lemo.ch/catalog/ROW/UK_English/unipole_multipole.pdf
footprint ERA.1S.305.CLN (Socket, Female, Body 12mm dia., Through hole)
pins: 1, 2, 3, 4, 5

## ERA.1S.306.CLN
designator J?
Fixed receptacle, nut fixing, 1S series, Multipole Type with 6 Contacts; Manufacturer: LEMO; PartNumber: ERA.1S.306.CLN; Number of contacts: 6; Contact Diameter: 0.7 mm; AWG: 24; Rated Current(A): 7; DatasheetVersion: Jun-14; PackageReference: ERA.1S.306.CLN; PackageDescription: Fixed receptacle, nut fixing,  for Printed Circuit; ComponentLink1Description: Manufacturer URL; ComponentLink1URL: http://www.lemo.com; ComponentLink2Description: Datasheet; ComponentLink2URL: http://intra.lemo.ch/catalog/ROW/UK_English/unipole_multipole.pdf
footprint ERA.1S.306.CLN (Socket, Female, Body 12mm dia., Through hole)
pins: 1, 2, 3, 4, 5, 6

## ERA.2E.306.CLN
designator J?
Fixed receptacle, nut fixing, Key (A), 2E series, Multipole Type with 6 Contacts; Manufacturer: LEMO; PartNumber: ERA.2E.306.CLN; Number of contacts: 6; Contact Diameter: 1.3 mm; AWG: 20; Rated Current(A): 12; DatasheetVersion: Jun-14; PackageReference: ERA.2E.306.CLN; PackageDescription: Fixed receptacle, nut fixing, Key(A) for Printed Circuit; ComponentLink1Description: Manufacturer URL; ComponentLink1URL: http://www.lemo.com; ComponentLink2Description: Datasheet; ComponentLink2URL: http://intra.lemo.ch/catalog/ROW/UK_English/unipole_multipole.pdf
footprint ERA.2E.306.CLN (Socket, Female, Body 20mm dia., Through hole)
pins: 1, 2, 3, 4, 5, 6
